# Altium footprint library C210 Rev_D_221221a.PcbLib: 89 footprints (part 4 of 6)
Each footprint in its own frame and in the unit in brackets; x right, y up, seen from the top. Pads: shape width x height; smd on the part's side, far side on the other; paste and mask are expansions set on the pad; w line width, h text height; cw(c..) or ccw(c..) is an arc to the next point about the centre after c.
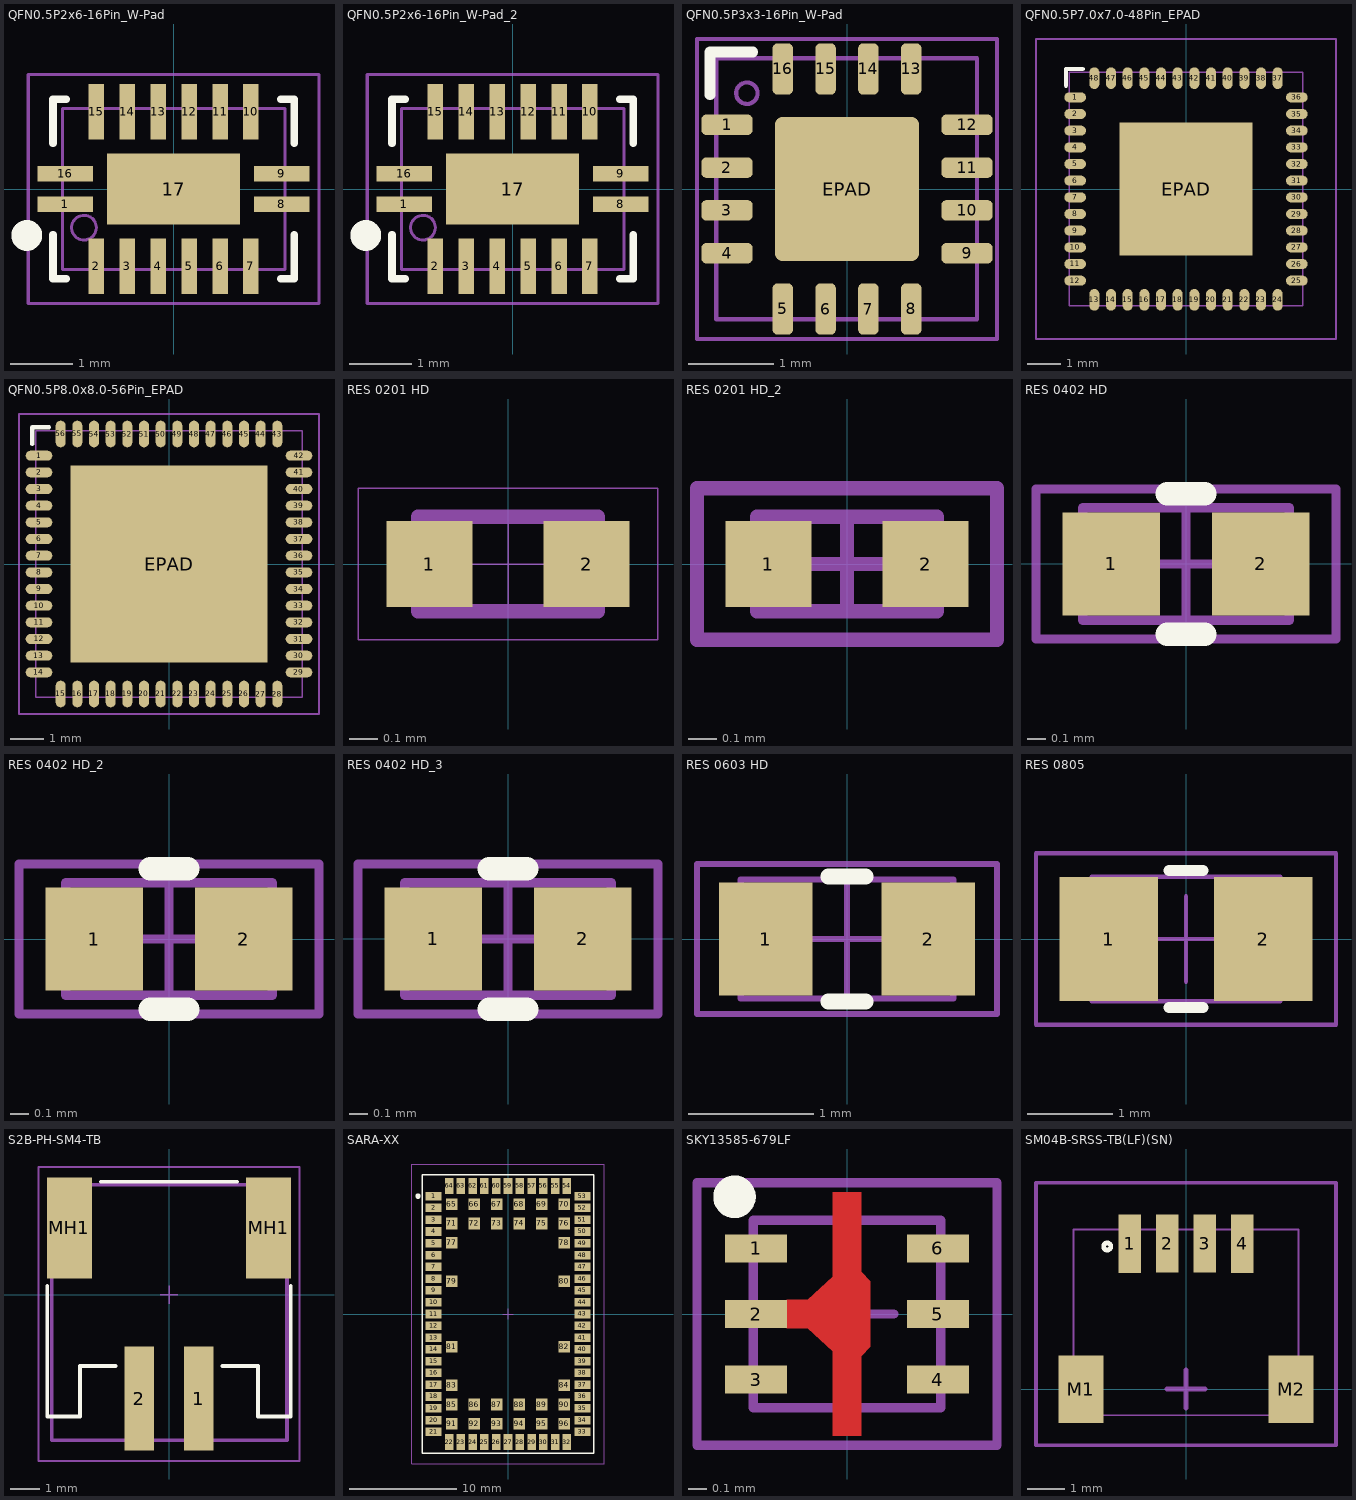
[diagram p3: the footprints below, top view; thin cyan lines are the x and y axes]

## QFN0.5P2x6-16Pin_W-Pad [mm]
pads (17):
  rect 0.9x0.25 smd paste-0.025 mask+0.05: 1(-1.75,-0.25) 8(1.75,-0.25) 9(1.75,0.25) 16(-1.75,0.25)
  rect 0.25x0.9 smd paste-0.025 mask+0.05: 2(-1.25,-1.25) 3(-0.75,-1.25) 4(-0.25,-1.25) 5(0.25,-1.25) 6(0.75,-1.25) 7(1.25,-1.25) 10(1.25,1.25) 11(0.75,1.25) 12(0.25,1.25) 13(-0.25,1.25) 14(-0.75,1.25) 15(-1.25,1.25)
  rect 2.15x1.15 smd paste-3 mask+0.05: 17(0,0)
Top Overlay:
  circle w0.25: c-2.375,-0.75 r0.125
  lines w0.127: -1.95,-0.738 -1.95,-1.45 -1.739,-1.45 ; -1.95,0.738 -1.95,1.45 -1.739,1.45 ; 1.739,-1.45 1.95,-1.45 1.95,-0.738 ; 1.739,1.45 1.95,1.45 1.95,0.738
Top Paste:
  rectangle: -0.55,-0.2 -0.15,0.2
  rectangle: 0.15,-0.2 0.55,0.2
Mechanical 11:
  text ".Designator" at 0.347,0.175 h0.5
Mechanical 13:
  circle w0.05: c-1.45,-0.625 r0.2
  lines w0.05: -1.8,-1.3 1.8,-1.3 1.8,1.3 -1.8,1.3 -1.8,-1.3
Mechanical 15:
  lines w0.05: -2.35,-1.85 2.35,-1.85 2.35,1.85 -2.35,1.85 -2.35,-1.85
  lines w0.1: -0.5,0 0.5,0 ; 0,-0.5 0,0.5
3D body: height 1, standoff 0, extent -1.8,-1.3 1.8,1.3

## QFN0.5P2x6-16Pin_W-Pad_2 [mm]
pads (17):
  rect 0.9x0.25 smd paste-0.025 mask+0.05: 1(-1.75,-0.25) 8(1.75,-0.25) 9(1.75,0.25) 16(-1.75,0.25)
  rect 0.25x0.9 smd paste-0.025 mask+0.05: 2(-1.25,-1.25) 3(-0.75,-1.25) 4(-0.25,-1.25) 5(0.25,-1.25) 6(0.75,-1.25) 7(1.25,-1.25) 10(1.25,1.25) 11(0.75,1.25) 12(0.25,1.25) 13(-0.25,1.25) 14(-0.75,1.25) 15(-1.25,1.25)
  rect 2.15x1.15 smd paste-3 mask+0.05: 17(0,0)
Top Overlay:
  circle w0.25: c-2.375,-0.75 r0.125
  lines w0.127: -1.95,-0.739 -1.95,-1.45 -1.739,-1.45 ; -1.95,0.738 -1.95,1.45 -1.739,1.45 ; 1.739,-1.45 1.95,-1.45 1.95,-0.739 ; 1.739,1.45 1.95,1.45 1.95,0.739
Top Paste:
  rectangle: -0.55,-0.2 -0.15,0.2
  rectangle: 0.15,-0.2 0.55,0.2
Mechanical 11:
  text ".Designator" at 0.586,0.317 h0.5
Mechanical 13:
  circle w0.05: c-1.45,-0.625 r0.2
  lines w0.05: -1.8,-1.3 1.8,-1.3 1.8,1.3 -1.8,1.3 -1.8,-1.3
Mechanical 15:
  lines w0.05: -2.35,-1.85 2.35,-1.85 2.35,1.85 -2.35,1.85 -2.35,-1.85
  lines w0.1: -0.5,0 0.5,0 ; 0,-0.5 0,0.5
3D body: height 1, standoff 0, extent -1.8,-1.3 1.8,1.3

## QFN0.5P3x3-16Pin_W-Pad [mm]
pads (17):
  rrect50% 0.6x0.24 smd: 1(-1.4,0.75) 2(-1.4,0.25) 3(-1.4,-0.25) 4(-1.4,-0.75) 9(1.4,-0.75) 10(1.4,-0.25) 11(1.4,0.25) 12(1.4,0.75)
  rrect50% 0.24x0.6 smd: 5(-0.75,-1.4) 6(-0.25,-1.4) 7(0.25,-1.4) 8(0.75,-1.4) 13(0.75,1.4) 14(0.25,1.4) 15(-0.25,1.4) 16(-0.75,1.4)
  rrect10% 1.68x1.68 smd: EPAD(0,0)
Top Overlay:
  lines w0.127: -1.6,1.1 -1.6,1.6 -1.1,1.6
Mechanical 11:
  text ".Designator" at 0.393,0.248 h0.5
Mechanical 13:
  circle w0.05: c-1.168,1.118 r0.125
  lines w0.05: -1.524,-1.521 -1.524,1.524 1.518,1.524 1.518,-1.521 -1.524,-1.521
Mechanical 15:
  lines w0.05: -0.35,0 0.35,0 ; 0,-0.35 0,0.35 ; -1.75,-1.75 1.75,-1.75 1.75,1.75 -1.75,1.75 -1.75,-1.75
3D body "ALSRobot-QFN16 3x3.STEP": height 0.9, standoff 0, extent -1.524,-1.521 1.518,1.521

## QFN0.5P7.0x7.0-48Pin_EPAD [mm]
pads (49):
  oval 0.65x0.3 smd paste-0.05 mask+0.05: 1(-3.325,2.75) 2(-3.325,2.25) 3(-3.325,1.75) 4(-3.325,1.25) 5(-3.325,0.75) 6(-3.325,0.25) 7(-3.325,-0.25) 8(-3.325,-0.75) 9(-3.325,-1.25) 10(-3.325,-1.75) 11(-3.325,-2.25) 12(-3.325,-2.75) 25(3.325,-2.75) 26(3.325,-2.25) 27(3.325,-1.75) 28(3.325,-1.25) 29(3.325,-0.75) 30(3.325,-0.25) 31(3.325,0.25) 32(3.325,0.75) 33(3.325,1.25) 34(3.325,1.75) 35(3.325,2.25) 36(3.325,2.75)
  oval 0.3x0.65 smd paste-0.05 mask+0.05: 13(-2.75,-3.325) 14(-2.25,-3.325) 15(-1.75,-3.325) 16(-1.25,-3.325) 17(-0.75,-3.325) 18(-0.25,-3.325) 19(0.25,-3.325) 20(0.75,-3.325) 21(1.25,-3.325) 22(1.75,-3.325) 23(2.25,-3.325) 24(2.75,-3.325) 37(2.75,3.325) 38(2.25,3.325) 39(1.75,3.325) 40(1.25,3.325) 41(0.75,3.325) 42(0.25,3.325) 43(-0.25,3.325) 44(-0.75,3.325) 45(-1.25,3.325) 46(-1.75,3.325) 47(-2.25,3.325) 48(-2.75,3.325)
  rect 4x4 smd paste-10 mask+0.05: EPAD(0,0)
Top Overlay:
  lines w0.127: -3.6,3.1 -3.6,3.6 -3.1,3.6
Top Paste:
  region: 0.5,-0.5 -0.5,-0.5 -0.5,0.5 0.5,0.5
  region: 0.5,-1 0.5,-2 -0.5,-2 -0.5,-1
  region: 1,-1 2,-1 2,-2 1,-2
  region: 1,-0.5 1,0.5 2,0.5 2,-0.5
  region: -1,-0.5 -2,-0.5 -2,0.5 -1,0.5
  region: -1,-2 -2,-2 -2,-1 -1,-1
  region: 1,2 2,2 2,1 1,1
  region: -0.5,2 0.5,2 0.5,1 -0.5,1
  region: -2,2 -1,2 -1,1 -2,1
Mechanical 11:
  text ".Designator" at -0.35,-0.325 h0.25
Mechanical 13:
  circle w0.05: c-3.325,2.75 r0.034
  lines w0.05: -3.5,-3.5 3.5,-3.5 3.5,3.5 -3.5,3.5 -3.5,-3.5
Mechanical 15:
  lines w0.05: -4.5,-4.5 4.5,-4.5 4.5,4.5 -4.5,4.5 -4.5,-4.5
  lines w0.1: -0.5,0 0.5,0 ; 0,-0.5 0,0.5
3D body "ALSRobot-QFN48 7x7.step": height 0.81, standoff 0.01, extent -3.51,-3.51 3.51,3.51

## QFN0.5P8.0x8.0-56Pin_EPAD [mm]
pads (57):
  oval 0.8x0.3 smd paste-0.05 mask+0.05: 1(-3.9,3.25) 2(-3.9,2.75) 3(-3.9,2.25) 4(-3.9,1.75) 5(-3.9,1.25) 6(-3.9,0.75) 7(-3.9,0.25) 8(-3.9,-0.25) 9(-3.9,-0.75) 10(-3.9,-1.25) 11(-3.9,-1.75) 12(-3.9,-2.25) 13(-3.9,-2.75) 14(-3.9,-3.25) 29(3.9,-3.25) 30(3.9,-2.75) 31(3.9,-2.25) 32(3.9,-1.75) 33(3.9,-1.25) 34(3.9,-0.75) 35(3.9,-0.25) 36(3.9,0.25) 37(3.9,0.75) 38(3.9,1.25) 39(3.9,1.75) 40(3.9,2.25) 41(3.9,2.75) 42(3.9,3.25)
  oval 0.3x0.8 smd paste-0.05 mask+0.05: 15(-3.25,-3.9) 16(-2.75,-3.9) 17(-2.25,-3.9) 18(-1.75,-3.9) 19(-1.25,-3.9) 20(-0.75,-3.9) 21(-0.25,-3.9) 22(0.25,-3.9) 23(0.75,-3.9) 24(1.25,-3.9) 25(1.75,-3.9) 26(2.25,-3.9) 27(2.75,-3.9) 28(3.25,-3.9) 43(3.25,3.9) 44(2.75,3.9) 45(2.25,3.9) 46(1.75,3.9) 47(1.25,3.9) 48(0.75,3.9) 49(0.25,3.9) 50(-0.25,3.9) 51(-0.75,3.9) 52(-1.25,3.9) 53(-1.75,3.9) 54(-2.25,3.9) 55(-2.75,3.9) 56(-3.25,3.9)
  rect 5.9x5.9 smd paste-10 mask+0.05: EPAD(0,0)
Top Overlay:
  lines w0.127: -4.1,3.6 -4.1,4.1 -3.6,4.1
Top Paste:
  region: -0.25,0.25 -1.25,0.25 -1.25,1.25 -0.25,1.25
  region: -0.25,-0.25 -0.25,-1.25 -1.25,-1.25 -1.25,-0.25
  region: 0.25,-0.25 1.25,-0.25 1.25,-1.25 0.25,-1.25
  region: 0.25,0.25 0.25,1.25 1.25,1.25 1.25,0.25
  region: -1.75,0.25 -2.75,0.25 -2.75,1.25 -1.75,1.25
  region: -1.75,-1.25 -2.75,-1.25 -2.75,-0.25 -1.75,-0.25
  region: 1.75,-0.25 2.75,-0.25 2.75,-1.25 1.75,-1.25
  region: -1.75,-2.75 -2.75,-2.75 -2.75,-1.75 -1.75,-1.75
  region: -0.25,-2.75 -1.25,-2.75 -1.25,-1.75 -0.25,-1.75
  region: 1.25,-2.75 0.25,-2.75 0.25,-1.75 1.25,-1.75
  region: 2.75,-2.75 1.75,-2.75 1.75,-1.75 2.75,-1.75
  region: 2.75,1.25 2.75,0.25 1.75,0.25 1.75,1.25
  region: 1.75,2.75 2.75,2.75 2.75,1.75 1.75,1.75
  region: 0.25,2.75 1.25,2.75 1.25,1.75 0.25,1.75
  region: -1.25,2.75 -0.25,2.75 -0.25,1.75 -1.25,1.75
  region: -2.75,2.75 -1.75,2.75 -1.75,1.75 -2.75,1.75
Mechanical 11:
  text ".Designator" at -0.35,-0.325 h0.25
Mechanical 13:
  circle w0.05: c-3.75,3.25 r0.034
  lines w0.05: -4,-4 4,-4 4,4 -4,4 -4,-4
Mechanical 15:
  lines w0.05: -4.5,-4.5 4.5,-4.5 4.5,4.5 -4.5,4.5 -4.5,-4.5
  lines w0.1: -0.5,0 0.5,0 ; 0,-0.5 0,0.5
3D body "User Library-VQFN_56.step": height 1.06, standoff -0.04, extent -4,-4 4,4

## RES 0201 HD [mm]
pads (2):
  rect 0.3x0.3 smd mask+0.05: 1(-0.275,0) 2(0.275,0)
Mechanical 11:
  text ".Designator" at -0.275,-0.05 h0.13
Mechanical 13:
  lines w0.05: -0.315,-0.165 0.315,-0.165 0.315,0.165 -0.315,0.165 -0.315,-0.165
Mechanical 15:
  lines w0.005: -0.165,0 0.165,0 ; 0,-0.165 0,0.165 ; -0.525,-0.265 -0.525,0.265 0.525,0.265 0.525,-0.265 -0.525,-0.265
3D body: height 0.25, standoff 0, extent -0.165,-0.165 0.165,0.165
3D body: height 0.25, standoff 0, extent -0.315,-0.165 -0.165,0.165
3D body: height 0.25, standoff 0, extent 0.165,-0.165 0.315,0.165

## RES 0201 HD_2 [mm]
pads (2):
  rect 0.3x0.3 smd mask+0.05: 1(-0.275,0) 2(0.275,0)
Mechanical 11:
  text ".Designator" at -0.6,-0.268 h0.5
Mechanical 13:
  lines w0.05: -0.315,-0.165 0.315,-0.165 0.315,0.165 -0.315,0.165 -0.315,-0.165
Mechanical 15:
  lines w0.05: -0.165,0 0.165,0 ; 0,-0.165 0,0.165 ; -0.525,-0.265 -0.525,0.265 0.525,0.265 0.525,-0.265 -0.525,-0.265
3D body: height 0.25, standoff 0, extent 0.165,-0.165 0.315,0.165
3D body: height 0.25, standoff 0, extent -0.315,-0.165 -0.165,0.165
3D body: height 0.25, standoff 0, extent -0.165,-0.165 0.165,0.165

## RES 0402 HD [mm]
pads (2):
  rect 0.52x0.55 smd: 1(-0.4,0) 2(0.4,0)
Top Overlay:
  lines w0.127: -0.1,-0.375 0.1,-0.375 ; -0.1,0.375 0.1,0.375
Mechanical 11:
  text ".Designator" at -0.55,-0.225 h0.5
Mechanical 13:
  lines w0.05: -0.55,-0.3 -0.55,0.3 0.55,0.3 0.55,-0.3 -0.55,-0.3
Mechanical 15:
  lines w0.05: -0.3,0 0.3,0 ; 0,-0.3 0,0.3 ; -0.8,-0.4 -0.8,0.4 0.8,0.4 0.8,-0.4 -0.8,-0.4
3D body: height 0.4, standoff 0, extent -0.35,-0.3 0.35,0.3
3D body: height 0.4, standoff 0, extent -0.55,-0.3 -0.35,0.3
3D body: height 0.4, standoff 0, extent 0.35,-0.3 0.55,0.3

## RES 0402 HD_2 [mm]
pads (2):
  rect 0.52x0.55 smd: 1(-0.4,0) 2(0.4,0)
Top Overlay:
  lines w0.127: -0.1,-0.375 0.1,-0.375 ; -0.1,0.375 0.1,0.375
Mechanical 11:
  text ".Designator" at -0.55,-0.225 h0.5
Mechanical 13:
  lines w0.05: -0.55,-0.3 0.55,-0.3 0.55,0.3 -0.55,0.3 -0.55,-0.3
Mechanical 15:
  lines w0.05: -0.3,0 0.3,0 ; 0,-0.3 0,0.3 ; -0.8,-0.4 0.8,-0.4 0.8,0.4 -0.8,0.4 -0.8,-0.4
3D body: height 0.4, standoff 0, extent 0.35,-0.3 0.55,0.3
3D body: height 0.4, standoff 0, extent -0.55,-0.3 -0.35,0.3
3D body: height 0.4, standoff 0, extent -0.35,-0.3 0.35,0.3

## RES 0402 HD_3 [mm]
pads (2):
  rect 0.52x0.55 smd: 1(-0.4,0) 2(0.4,0)
Top Overlay:
  lines w0.127: -0.1,-0.375 0.1,-0.375 ; -0.1,0.375 0.1,0.375
Mechanical 11:
  text ".Designator" at -0.55,-0.225 h0.5
Mechanical 13:
  lines w0.05: -0.55,-0.3 0.55,-0.3 0.55,0.3 -0.55,0.3 -0.55,-0.3
Mechanical 15:
  lines w0.05: -0.3,0 0.3,0 ; 0,-0.3 0,0.3 ; -0.8,-0.4 0.8,-0.4 0.8,0.4 -0.8,0.4 -0.8,-0.4
3D body: height 0.4, standoff 0, extent 0.35,-0.3 0.55,0.3
3D body: height 0.4, standoff 0, extent -0.55,-0.3 -0.35,0.3
3D body: height 0.4, standoff 0, extent -0.35,-0.3 0.35,0.3

## RES 0603 HD [mm]
pads (2):
  rect 0.75x0.9 smd: 1(-0.65,0) 2(0.65,0)
Top Overlay:
  lines w0.127: -0.15,-0.5 0.15,-0.5 ; -0.15,0.5 0.15,0.5
Mechanical 11:
  text ".Designator" at -1.075,-0.325 h0.7
Mechanical 13:
  lines w0.05: -0.85,-0.475 -0.85,0.475 0.85,0.475 0.85,-0.475 -0.85,-0.475
Mechanical 15:
  lines w0.05: -0.475,0 0.475,0 ; 0,-0.475 0,0.475 ; -1.2,-0.6 -1.2,0.6 1.2,0.6 1.2,-0.6 -1.2,-0.6
3D body: height 0.55, standoff 0, extent -0.55,-0.475 0.55,0.475
3D body: height 0.55, standoff 0, extent -0.85,-0.475 -0.55,0.475
3D body: height 0.55, standoff 0, extent 0.55,-0.475 0.85,0.475

## RES 0805 [mm]
pads (2):
  rect 1.15x1.45 smd: 1(-0.9,0) 2(0.9,0)
Top Overlay:
  lines w0.127: -0.2,-0.8 0.2,-0.8 ; -0.2,0.8 0.2,0.8
Mechanical 11:
  text ".Designator" at -0.975,-0.4 h0.8
Mechanical 13:
  lines w0.05: -1.1,-0.725 -1.1,0.725 1.1,0.725 1.1,-0.725 -1.1,-0.725
Mechanical 15:
  lines w0.05: -0.5,0 0.5,0 ; 0,-0.5 0,0.5 ; -1.75,-1 -1.75,1 1.75,1 1.75,-1 -1.75,-1
3D body: height 0.65, standoff 0, extent -0.6,-0.725 0.6,0.725
3D body: height 0.65, standoff 0, extent -1.1,-0.725 -0.6,0.725
3D body: height 0.65, standoff 0, extent 0.6,-0.725 1.1,0.725

## S2B-PH-SM4-TB [mm]
pads (4):
  rect 1x3.5 smd: 1(1,-3.5) 2(-1,-3.5)
  rect 1.5x3.4 smd: MH1(-3.35,2.25) MH1(3.35,2.25)
Top Overlay:
  lines w0.127: -4.1,0.3 -4.1,-4.1 -3,-4.1 -3,-2.4 -1.8,-2.4 ; -2.3,3.8 2.3,3.8 ; 1.8,-2.4 3,-2.4 3,-4.1 4.1,-4.1 4.1,0.3
Mechanical 11:
  text ".Designator" at -0.575,0.092 h0.5
Mechanical 13:
  lines w0.127: -3.95,-4.9 3.975,-4.9 3.975,3.7 -3.95,3.7 -3.95,-4.9
Mechanical 15:
  lines w0.05: -0.3,0 0.3,0 ; 0,-0.3 0,0.3
  lines w0.064: -4.4,-5.6 -4.4,4.3 4.4,4.3 4.4,-5.6 -4.4,-5.6
3D body "S2B-PH-SM4-TB.STEP": height 5.61, standoff 0.01, extent -3.925,-4.9 3.975,3.7

## SARA-XX [mm]
pads (96):
  rect 1.5x0.8 smd paste-1: 1(-6.95,11) 2(-6.95,9.9) 3(-6.95,8.8) 4(-6.95,7.7) 5(-6.95,6.6) 6(-6.95,5.5) 7(-6.95,4.4) 8(-6.95,3.3) 9(-6.95,2.2) 10(-6.95,1.1) 11(-6.95,0) 12(-6.95,-1.1) 13(-6.95,-2.2) 14(-6.95,-3.3) 15(-6.95,-4.4) 16(-6.95,-5.5) 17(-6.95,-6.6) 18(-6.95,-7.7) 19(-6.95,-8.8) 20(-6.95,-9.9) 21(-6.95,-11) 33(6.95,-11) 34(6.95,-9.9) 35(6.95,-8.8) 36(6.95,-7.7) 37(6.95,-6.6) 38(6.95,-5.5) 39(6.95,-4.4) 40(6.95,-3.3) 41(6.95,-2.2) 42(6.95,-1.1) 43(6.95,0) 44(6.95,1.1) 45(6.95,2.2) 46(6.95,3.3) 47(6.95,4.4) 48(6.95,5.5) 49(6.95,6.6) 50(6.95,7.7) 51(6.95,8.8) 52(6.95,9.9) 53(6.95,11)
  rect 0.8x1.5 smd paste-1: 22(-5.5,-11.95) 23(-4.4,-11.95) 24(-3.3,-11.95) 25(-2.2,-11.95) 26(-1.1,-11.95) 27(0,-11.95) 28(1.1,-11.95) 29(2.2,-11.95) 30(3.3,-11.95) 31(4.4,-11.95) 32(5.5,-11.95) 54(5.5,11.95) 55(4.4,11.95) 56(3.3,11.95) 57(2.2,11.95) 58(1.1,11.95) 59(0,11.95) 60(-1.1,11.95) 61(-2.2,11.95) 62(-3.3,11.95) 63(-4.4,11.95) 64(-5.5,11.95)
  rect 1.1x1.1 smd paste-0.025: 65(-5.25,10.25) 66(-3.15,10.25) 67(-1.05,10.25) 68(1.05,10.25) 69(3.15,10.25) 70(5.25,10.25) 71(-5.25,8.45) 72(-3.15,8.45) 73(-1.05,8.45) 74(1.05,8.45) 75(3.15,8.45) 76(5.25,8.45) 77(-5.25,6.65) 78(5.25,6.65) 79(-5.25,3.05) 80(5.25,3.05) 81(-5.25,-3.05) 82(5.25,-3.05) 83(-5.25,-6.65) 84(5.25,-6.65) 85(-5.25,-8.45) 86(-3.15,-8.45) 87(-1.05,-8.45) 88(1.05,-8.45) 89(3.15,-8.45) 90(5.25,-8.45) 91(-5.25,-10.25) 92(-3.15,-10.25) 93(-1.05,-10.25) 94(1.05,-10.25) 95(3.15,-10.25) 96(5.25,-10.25)
Top Overlay:
  circle w0.4: c-8.4,11 r0.05
  lines w0.15: -8,-13 -8,13 8,13 8,-13 -8,-13
Top Paste:
  region: -5.125,11.226 -5.125,12.776 -5.875,12.776 -5.875,11.226
  region: -4.024,11.225 -4.024,12.775 -4.774,12.775 -4.774,11.225
  region: -2.924,11.225 -2.924,12.775 -3.674,12.775 -3.674,11.225
  region: -1.824,11.225 -1.824,12.775 -2.574,12.775 -2.574,11.225
  region: -0.724,11.225 -0.724,12.775 -1.474,12.775 -1.474,11.225
  region: 0.375,11.226 0.375,12.776 -0.375,12.776 -0.375,11.226
  region: 1.476,11.225 1.476,12.775 0.726,12.775 0.726,11.225
  region: 5.876,11.225 5.876,12.775 5.126,12.775 5.126,11.225
  region: 2.575,11.226 2.575,12.776 1.825,12.776 1.825,11.226
  region: 3.676,11.225 3.676,12.775 2.926,12.775 2.926,11.225
  region: 4.775,11.226 4.775,12.776 4.025,12.776 4.025,11.226
  rectangle: 6.225,10.624 7.775,11.374
  rectangle: 6.225,9.524 7.775,10.274
  rectangle: 6.226,8.425 7.776,9.175
  rectangle: 6.225,7.324 7.775,8.074
  rectangle: 6.226,6.225 7.776,6.975
  rectangle: 6.225,5.124 7.775,5.874
  rectangle: 6.226,4.025 7.776,4.775
  rectangle: 6.225,2.924 7.775,3.674
  rectangle: 6.226,1.825 7.776,2.575
  rectangle: 6.226,0.725 7.776,1.475
  rectangle: 6.225,-0.376 7.775,0.374
  rectangle: 6.226,-1.475 7.776,-0.725
  rectangle: 6.225,-2.576 7.775,-1.826
  rectangle: 6.226,-3.675 7.776,-2.925
  rectangle: 6.225,-4.776 7.775,-4.026
  rectangle: 6.226,-5.875 7.776,-5.125
  rectangle: 6.226,-6.975 7.776,-6.225
  rectangle: 6.225,-8.076 7.775,-7.326
  rectangle: 6.226,-9.175 7.776,-8.425
  rectangle: 6.225,-10.276 7.775,-9.526
  rectangle: 6.226,-11.375 7.776,-10.625
  region: 5.875,-12.774 5.875,-11.224 5.125,-11.224 5.125,-12.774
  region: 4.776,-12.775 4.776,-11.225 4.026,-11.225 4.026,-12.775
  region: 3.675,-12.774 3.675,-11.224 2.925,-11.224 2.925,-12.774
  region: 2.576,-12.775 2.576,-11.225 1.826,-11.225 1.826,-12.775
  region: 1.475,-12.774 1.475,-11.224 0.725,-11.224 0.725,-12.774
  region: 0.376,-12.775 0.376,-11.225 -0.374,-11.225 -0.374,-12.775
  region: -0.724,-12.775 -0.724,-11.225 -1.474,-11.225 -1.474,-12.775
  region: -1.825,-12.774 -1.825,-11.224 -2.575,-11.224 -2.575,-12.774
  region: -2.924,-12.775 -2.924,-11.225 -3.674,-11.225 -3.674,-12.775
  region: -4.025,-12.774 -4.025,-11.224 -4.775,-11.224 -4.775,-12.774
  region: -5.124,-12.775 -5.124,-11.225 -5.874,-11.225 -5.874,-12.775
  rectangle: -7.774,-11.375 -6.224,-10.625
  rectangle: -7.775,-10.276 -6.225,-9.526
  rectangle: -7.774,-9.175 -6.224,-8.425
  rectangle: -7.775,-8.076 -6.225,-7.326
  rectangle: -7.774,-6.975 -6.224,-6.225
  rectangle: -7.774,-5.875 -6.224,-5.125
  rectangle: -7.775,-4.776 -6.225,-4.026
  rectangle: -7.774,-3.675 -6.224,-2.925
  rectangle: -7.775,-2.576 -6.225,-1.826
  rectangle: -7.774,-1.475 -6.224,-0.725
  rectangle: -7.775,-0.376 -6.225,0.374
  rectangle: -7.774,0.725 -6.224,1.475
  rectangle: -7.774,1.825 -6.224,2.575
  rectangle: -7.775,2.924 -6.225,3.674
  rectangle: -7.774,4.025 -6.224,4.775
  rectangle: -7.775,5.124 -6.225,5.874
  rectangle: -7.774,6.225 -6.224,6.975
  rectangle: -7.775,7.324 -6.225,8.074
  rectangle: -7.774,8.425 -6.224,9.175
  rectangle: -7.775,9.524 -6.225,10.274
  rectangle: -7.775,10.624 -6.225,11.374
Mechanical 15:
  lines w0.05: -9,-14 -9,14 9,14 9,-14 -9,-14
  lines w0.1: -0.5,0 0,0 0.5,0 ; 0,-0.5 0,0.5
  text ".Designator" at 0.1,0.433 h1
3D body "SARA-R5_step.STEP": height 2.21, standoff 0.01, extent -8.008,-12.994 7.992,13.006
3D body "SARA.STEP": height 0.13, standoff -2.87, extent -8,-13.05 8,12.95

## SKY13585-679LF [mm]
pads (6):
  rect 0.33x0.15 smd mask+0.05: 1(-0.485,0.35) 2(-0.485,0) 3(-0.485,-0.35) 4(0.485,-0.35) 5(0.485,0) 6(0.485,0.35)
Top Layer:
  region: -0.075,0.65 0.075,0.65 0.075,-0.65 -0.075,-0.65
  region: -0.21,-0.075 -0.075,-0.198 -0.075,0.198 -0.21,0.075 -0.321,0.075 -0.321,-0.075
  region: 0.075,0.225 0.125,0.175 0.125,-0.175 0.075,-0.225
Top Overlay:
  circle w0.127: c-0.6,0.625 r0.05
Top Paste:
  region: -0.075,0.65 0.075,0.65 0.075,-0.65 -0.075,-0.65
  region: -0.21,-0.075 -0.075,-0.198 -0.075,0.198 -0.21,0.075 -0.321,0.075 -0.321,-0.075
  region: 0.075,0.225 0.125,0.175 0.125,-0.175 0.075,-0.225
Top Solder:
  region: -0.275,-0.125 -0.225,-0.125 -0.125,-0.225 -0.125,-0.7 0.125,-0.7 0.125,-0.225 0.175,-0.175 0.175,0.2 0.125,0.25 0.125,0.7 -0.125,0.7 -0.125,0.225 -0.225,0.125 -0.275,0.125
Mechanical 11:
  text ".Designator" at -0.6,-0.3 h0.5
Mechanical 13:
  circle w0.05: c-0.4,0.35 r0.025
  lines w0.05: -0.5,-0.5 0.5,-0.5 0.5,0.5 -0.5,0.5 -0.5,-0.5
Mechanical 15:
  lines w0.05: -0.25,0 0.25,0 ; 0,-0.25 0,0.25 ; 0,-0.1 0,0.1 ; -0.8,-0.7 0.8,-0.7 0.8,0.7 -0.8,0.7 -0.8,-0.7
3D body: height 0.36, standoff 0.35, extent -0.5,0.3 -0.3,0.5
3D body: height 0.35, standoff 0.01, extent -0.5,-0.5 0.5,0.5

## SM04B-SRSS-TB(LF)(SN) [mm]
pads (6):
  rect 0.6x1.55 smd: 1(-1.5,3.875) 2(-0.5,3.875) 3(0.5,3.875) 4(1.5,3.875)
  rect 1.2x1.8 smd: M1(-2.8,0) M2(2.8,0)
Top Overlay:
  circle w0.127: c-2.1,3.8 r0.096
Mechanical 11:
  text ".Designator" at 0.225,1.025 h0.5
Mechanical 13:
  lines w0.05: -3,-0.7 3,-0.7 3,4.255 -3,4.255 -3,-0.7
Mechanical 15:
  lines w0.1: -4,-1.5 4,-1.5 4,5.5 -4,5.5 -4,-1.5
  lines w0.127: -0.508,0 0.508,0 ; 0,-0.508 0,0.508
3D body "SM04B-SRSS-TB.STEP": height 2.96, standoff 0, extent -3,-0.695 3,4.255